# Altium footprint library PCB_Display_Doru.PcbLib: 47 footprints (part 2 of 3)
Each footprint in its own frame and in the unit in brackets; x right, y up, seen from the top. Pads: shape width x height; smd on the part's side, far side on the other; paste and mask are expansions set on the pad; w line width, h text height; cw(c..) or ccw(c..) is an arc to the next point about the centre after c.
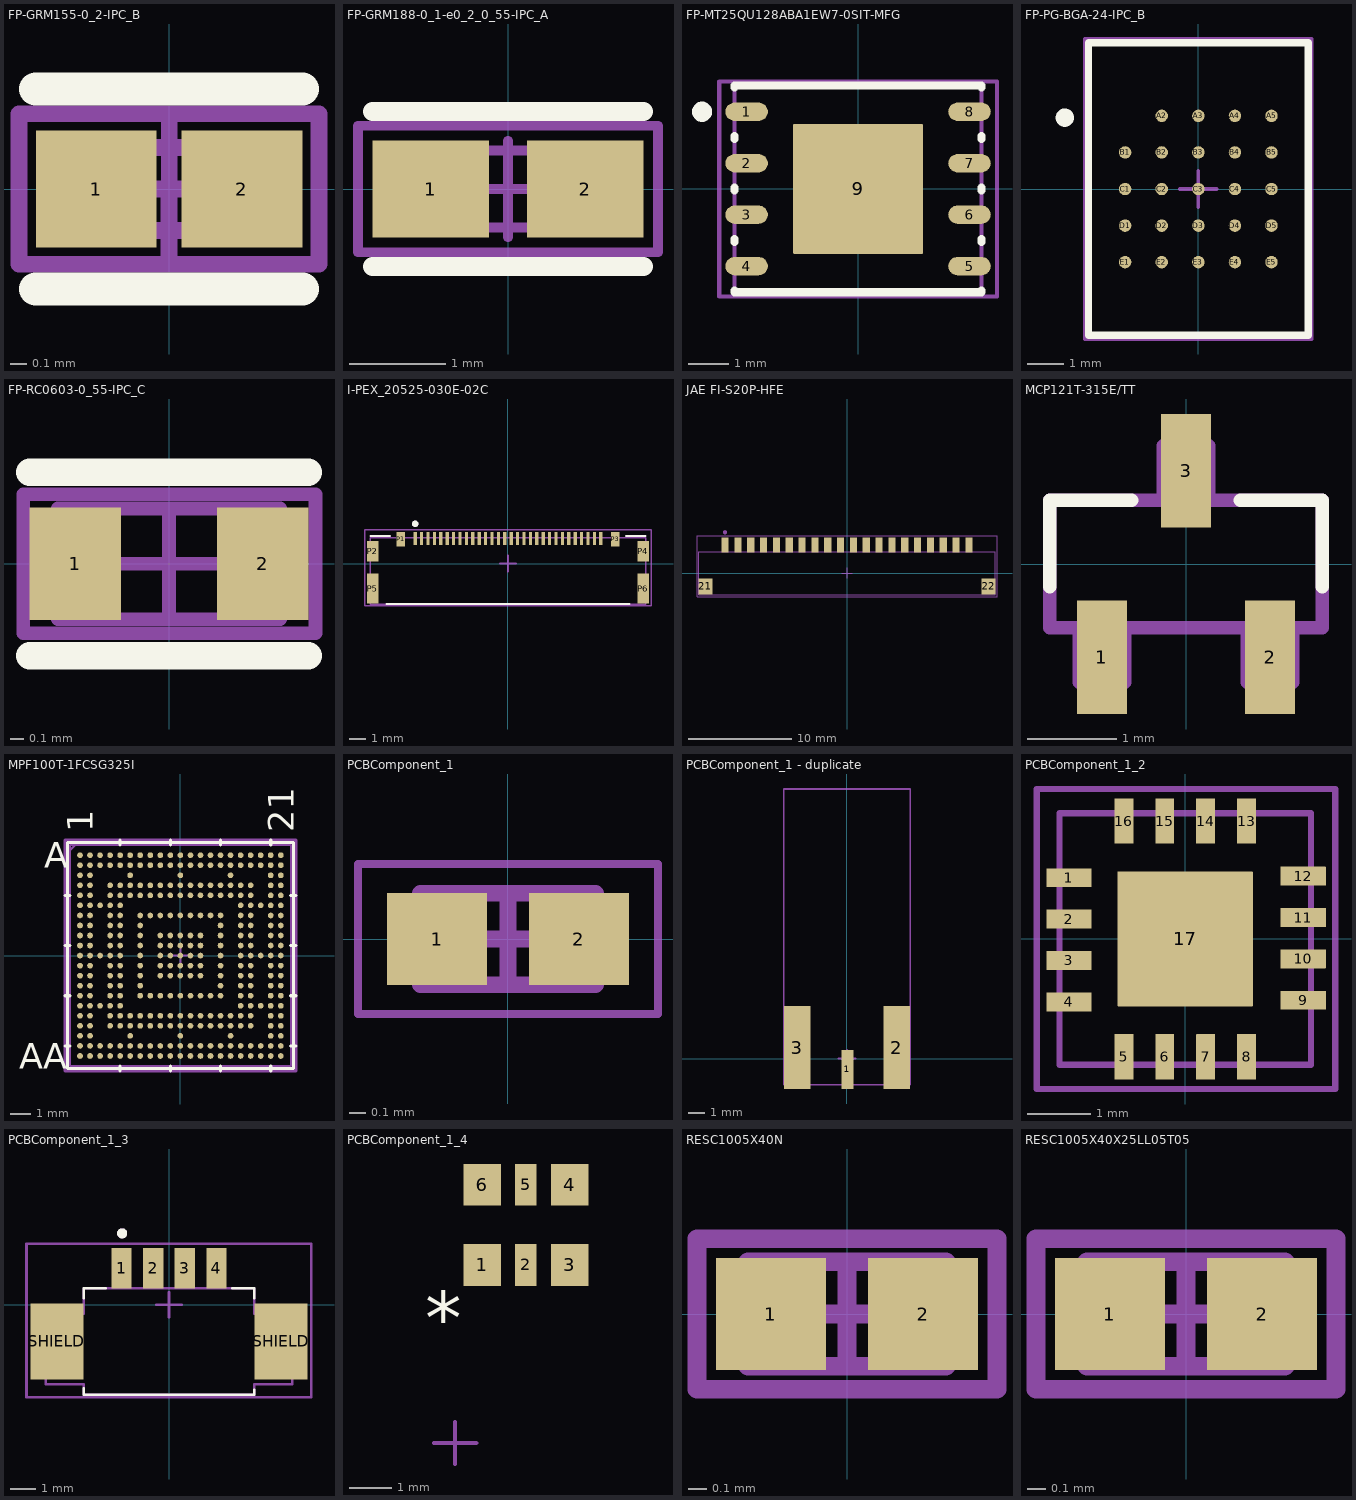
[diagram p1: the footprints below, top view; thin cyan lines are the x and y axes]

## FP-GRM155-0_2-IPC_B [mm]
height 8.35
pads (2):
  rrect1% 0.728x0.706 smd paste+0 mask+0.05: 1(-0.439,0) 2(0.439,0)
Top Overlay:
  lines w0.2: -0.803,-0.603 0.803,-0.603 ; -0.803,0.603 0.803,0.603
Top Assembly (Mech13):
  lines w0.1: -0.5,-0.25 -0.5,0.25 0.5,0.25 0.5,-0.25 -0.5,-0.25
  text ".Designator" at -0.646,-0.054 h0.3
Top Component Outline (Mech15):
  lines w0.1: -0.453,0 0.453,0 ; -0.001,-0.453 0,0.453 ; -0.904,-0.453 0.903,-0.453 0.903,0.453 -0.904,0.453 -0.904,-0.453
3D body "Cap_Murata_GRM155R61E225KE11D_eec.STEP": height 0.7, standoff 0, extent -0.5,-0.25 0.5,0.25

## FP-GRM188-0_1-e0_2_0_55-IPC_A [mm]
height 8.35
pads (2):
  rrect1% 1.208x1.012 smd paste+0: 1(-0.802,0) 2(0.802,0)
Top Overlay:
  lines w0.2: -1.406,-0.806 1.406,-0.806 ; -1.406,0.806 1.406,0.806
Top Assembly (Mech13):
  lines w0.1: -0.8,-0.4 -0.8,0.4 0.8,0.4 0.8,-0.4 -0.8,-0.4
  text ".Designator" at -0.666,-0.049 h0.3
Top Component Outline (Mech15):
  lines w0.1: -0.5,0 0.5,0 ; 0,-0.5 0,0.5 ; -1.558,-0.657 -1.558,0.658 1.558,0.658 1.558,-0.657 -1.558,-0.657
3D body "Cap_Murata_GRM188R60J106KE47D_eec.STEP": height 0.9, standoff 0, extent -0.8,-0.4 0.8,0.4

## FP-MT25QU128ABA1EW7-0SIT-MFG [mm]
height 8.35
pads (9):
  rrect100% 1.05x0.45 smd paste+0: 1(-2.75,1.905) 2(-2.75,0.635) 3(-2.75,-0.635) 4(-2.75,-1.905) 5(2.75,-1.905) 6(2.75,-0.635) 7(2.75,0.635) 8(2.75,1.905)
  rrect1% 3.2x3.2 smd: 9(0,0)
Top Overlay:
  circle w0.25: c-3.85,1.905 r0.125
  lines w0.2: -3.05,-2.505 -3.05,-2.55 3.05,-2.55 3.05,-2.505 ; -3.05,-1.305 -3.05,-1.235 ; -3.05,-0.035 -3.05,0.035 ; -3.05,1.235 -3.05,1.305 ; -3.05,2.505 -3.05,2.55 3.05,2.55 3.05,2.505 ; 3.05,-1.305 3.05,-1.235 ; 3.05,-0.035 3.05,0.035 ; 3.05,1.235 3.05,1.305
Top Assembly (Mech13):
  lines w0.1: -3.05,-2.55 -3.05,2.55 3.05,2.55 3.05,-2.55 -3.05,-2.55
  text ".Designator" at -0.588,-0.078 h0.3
Top Component Outline (Mech15):
  lines w0.1: -0.5,0 0.5,0 ; 0,-0.5 0,0.5 ; -3.426,-2.651 -3.426,2.649 3.428,2.649 3.428,-2.651 -3.426,-2.651
3D body "IC_Micron_MT25QU128ABA1EW7-0SIT_eec.STEP": height 0.8, standoff 0, extent -3.01,-2.5 3.01,2.5

## FP-PG-BGA-24-IPC_B [mm]
height 8.35
pads (24):
  round 0.34 smd paste+0: A2(-1,2) A3(0,2) A4(1,2) A5(2,2) B1(-2,1) B2(-1,1) B3(0,1) B4(1,1) B5(2,1) C1(-2,0) C2(-1,0) C3(0,0) C4(1,0) C5(2,0) D1(-2,-1) D2(-1,-1) D3(0,-1) D4(1,-1) D5(2,-1) E1(-2,-2) E2(-1,-2) E3(0,-2) E4(1,-2) E5(2,-2)
Top Overlay:
  circle w0.25: c-3.65,1.95 r0.125
  lines w0.2: -3,-4 -3,4 3,4 3,-4 -3,-4
Top Assembly (Mech13):
  lines w0.1: -3,-4 -3,4 3,4 3,-4 -3,-4
  text ".Designator" at -0.597,-0.065 h0.3
Top Component Outline (Mech15):
  lines w0.1: -0.5,0 0.5,0 ; 0,-0.5 0,0.5 ; -3.101,-4.099 3.1,-4.099 3.1,4.1 -3.101,4.1 -3.101,-4.099
3D body "IC_Infineon_Technologies_S80KS5123GABHI020_eec.STEP": height 1, standoff 0, extent -3,-4 3,4

## FP-RC0603-0_55-IPC_C [mm]
pads (2):
  rrect1% 0.659x0.812 smd paste+0 mask+0: 1(-0.677,0) 2(0.677,0)
Top Overlay:
  lines w0.2: -1.006,-0.663 1.006,-0.663 ; -1.006,0.66 1.006,0.66
Top Assembly (Mech13):
  lines w0.1: -0.8,-0.4 -0.8,0.4 0.8,0.4 0.8,-0.4 -0.8,-0.4
  text ".Designator" at -0.635,-0.071 h0.3
Top Component Outline (Mech15):
  lines w0.1: -0.4,0 0.4,0 ; 0,-0.4 0,0.4 0,0 ; -1.052,-0.501 -1.052,0.502 1.057,0.502 1.057,-0.501 -1.052,-0.501
3D body "Res_Yageo_RC0603FR-07100KL_eec.STEP": height 0.55, standoff 0, extent -0.8,-0.4 0.8,0.4

## I-PEX_20525-030E-02C [mm]
height 1.1
pads (36):
  rrect1% 0.2x0.8 smd mask+0.05: 1(-5.8,1.562) 2(-5.4,1.562) 3(-5,1.562) 4(-4.6,1.563) 5(-4.2,1.562) 6(-3.8,1.562) 7(-3.4,1.563) 8(-3,1.562) 9(-2.6,1.563) 10(-2.2,1.562) 11(-1.8,1.562) 12(-1.4,1.562) 13(-1,1.563) 14(-0.6,1.562) 15(-0.2,1.562) 16(0.2,1.562) 17(0.6,1.562) 18(1,1.563) 19(1.4,1.562) 20(1.8,1.562) 21(2.2,1.563) 22(2.6,1.562) 23(3,1.562) 24(3.4,1.562) 25(3.8,1.562) 26(4.2,1.562) 27(4.6,1.563) 28(5,1.562) 29(5.4,1.562) 30(5.8,1.562)
  rrect1% 0.55x0.9 smd: P1(-6.7,1.513) P3(6.7,1.512)
  rrect1% 0.71x1.3 smd: P2(-8.445,0.763) P4(8.445,0.763)
  rrect1% 0.71x1.85 smd: P5(-8.445,-1.562) P6(8.445,-1.562)
Top Overlay:
  circle w0.2: c-5.8,2.483 r0.1
  lines w0.127: -8.6,1.728 -7.37,1.728 ; -7.595,-2.537 7.595,-2.537 ; 7.37,1.728 8.6,1.728
Top Assembly (Mech13):
  circle w0.2: c-5.8,2.483 r0.1
  lines w0.1: -8.6,-2.537 8.6,-2.537 8.6,1.613 -8.6,1.613 -8.6,-2.537
  text ".Designator" at -0.612,-0.076 h0.3
Top Component Outline (Mech15):
  lines w0.1: -0.5,0 0.5,0 ; 0,-0.5 0,0.5 ; -8.953,-2.64 8.952,-2.64 8.952,2.113 -8.953,2.113 -8.953,-2.64
3D body "20525-x30E-02C_RECE_ASS'Y_STEP_R7_ALL.STEP": height 1, standoff 0, extent -8.6,-2.537 8.6,1.613

## JAE FI-S20P-HFE [mm]
pads (22):
  rrect1% 0.7x1.45 smd: 1(-11.875,2.754) 2(-10.625,2.754) 3(-9.375,2.754) 4(-8.125,2.754) 5(-6.875,2.754) 6(-5.625,2.754) 7(-4.375,2.754) 8(-3.125,2.754) 9(-1.875,2.754) 10(-0.625,2.754) 11(0.625,2.754) 12(1.875,2.754) 13(3.125,2.754) 14(4.375,2.754) 15(5.625,2.754) 16(6.875,2.754) 17(8.125,2.754) 18(9.375,2.754) 19(10.625,2.754) 20(11.875,2.754)
  rrect1% 1.35x1.6 smd: 21(-13.775,-1.3) 22(13.775,-1.3)
Top Assembly (Mech13):
  circle w0.2: c-11.875,3.974 r0.1
  lines w0.1: -14.45,-2.1 -14.45,2.1 14.45,2.1 14.45,-2.1 -14.45,-2.1
  text ".Designator" at -0.612,-0.076 h0.3
Top Component Outline (Mech15):
  lines w0.1: -0.5,0 0.5,0 ; 0,-0.5 0,0.5 ; -14.602,-2.297 -14.602,3.63 14.601,3.626 14.601,-2.297 -14.602,-2.297
3D body "K3D-FI-S20P-HFE_V1_JAE_Proprietary.step": height 1.81, standoff 0.01, extent -14.308,-2.244 14.292,3.056

## MCP121T-315E/TT [mil]
pads (3):
  rect 22x50 smd: 1(-37,-41) 2(37,-41) 3(0,41)
Top Overlay:
  lines w6: -60,-10 -60,28 -24,28 ; 24,28 60,28 60,-10
Top Assembly (Mech13):
  lines w6: -60,-28 -60,28 60,28 60,-28 -60,-28 ; -47,-52 -27,-52 -27,-28 -47,-28 -47,-52 ; -10,28 -10,52 10,52 10,28 -10,28 ; 27,-52 47,-52 47,-28 27,-28 27,-52
3D body "MCP121T-315E_TT.STEP": height 44.09, standoff 0, extent -57.09,-46.65 57.09,46.65

## MPF100T-1FCSG325I [mm]
pads (325):
  round 0.284 smd paste+0 mask+0: A1(-5,5) A2(-4.5,5) A3(-4,5) A4(-3.5,5) A5(-3,5) A6(-2.5,5) A7(-2,5) A8(-1.5,5) A9(-1,5) A10(-0.5,5) A11(0,5) A12(0.5,5) A13(1,5) A14(1.5,5) A15(2,5) A16(2.5,5) A17(3,5) A18(3.5,5) A19(4,5) A20(4.5,5) A21(5,5) AA1(-5,-5) AA2(-4.5,-5) AA3(-4,-5) AA4(-3.5,-5) AA5(-3,-5) AA6(-2.5,-5) AA7(-2,-5) AA8(-1.5,-5) AA9(-1,-5) AA10(-0.5,-5) AA11(0,-5) AA12(0.5,-5) AA13(1,-5) AA14(1.5,-5) AA15(2,-5) AA16(2.5,-5) AA17(3,-5) AA18(3.5,-5) AA19(4,-5) AA20(4.5,-5) AA21(5,-5) B1(-5,4.5) B2(-4.5,4.5) B3(-4,4.5) B4(-3.5,4.5) B5(-3,4.5) B6(-2.5,4.5) B7(-2,4.5) B8(-1.5,4.5) B9(-1,4.5) B10(-0.5,4.5) B11(0,4.5) B12(0.5,4.5) B13(1,4.5) B14(1.5,4.5) B15(2,4.5) B16(2.5,4.5) B17(3,4.5) B18(3.5,4.5) B19(4,4.5) B20(4.5,4.5) B21(5,4.5) C1(-5,4) C2(-4.5,4) C6(-2.5,4) C11(0,4) C16(2.5,4) C20(4.5,4) C21(5,4) D1(-5,3.5) D2(-4.5,3.5) D4(-3.5,3.5) D5(-3,3.5) D6(-2.5,3.5) D7(-2,3.5) D8(-1.5,3.5) D9(-1,3.5) D10(-0.5,3.5) D11(0,3.5) D12(0.5,3.5) D13(1,3.5) D14(1.5,3.5) D15(2,3.5) D16(2.5,3.5) D17(3,3.5) D18(3.5,3.5) D20(4.5,3.5) D21(5,3.5) E1(-5,3) E2(-4.5,3) E4(-3.5,3) E5(-3,3) E6(-2.5,3) E7(-2,3) E8(-1.5,3) E9(-1,3) E10(-0.5,3) E11(0,3) E12(0.5,3) E13(1,3) E14(1.5,3) E15(2,3) E16(2.5,3) E17(3,3) E18(3.5,3) E20(4.5,3) E21(5,3) F1(-5,2.5) F2(-4.5,2.5) F3(-4,2.5) F4(-3.5,2.5) F5(-3,2.5) F17(3,2.5) F18(3.5,2.5) F19(4,2.5) F20(4.5,2.5) F21(5,2.5) G1(-5,2) G2(-4.5,2) G4(-3.5,2) G5(-3,2) G7(-2,2) G8(-1.5,2) G9(-1,2) G10(-0.5,2) G11(0,2) G12(0.5,2) G13(1,2) G14(1.5,2) G15(2,2) G17(3,2) G18(3.5,2) G20(4.5,2) G21(5,2) H1(-5,1.5) H2(-4.5,1.5) H4(-3.5,1.5) H5(-3,1.5) H7(-2,1.5) H15(2,1.5) H17(3,1.5) H18(3.5,1.5) H20(4.5,1.5) H21(5,1.5) J1(-5,1) J2(-4.5,1) J4(-3.5,1) J5(-3,1) J7(-2,1) J9(-1,1) J10(-0.5,1) J11(0,1) J12(0.5,1) J13(1,1) J15(2,1) J17(3,1) J18(3.5,1) J20(4.5,1) J21(5,1) K1(-5,0.5) K2(-4.5,0.5) K4(-3.5,0.5) K5(-3,0.5) K7(-2,0.5) K9(-1,0.5) K10(-0.5,0.5) K11(0,0.5) K12(0.5,0.5) K13(1,0.5) K15(2,0.5) K17(3,0.5) K18(3.5,0.5) K20(4.5,0.5) K21(5,0.5) L1(-5,0) L2(-4.5,0) L3(-4,0) L4(-3.5,0) L5(-3,0) L7(-2,0) L9(-1,0) L10(-0.5,0) L11(0,0) L12(0.5,0) L13(1,0) L15(2,0) L17(3,0) L18(3.5,0) L19(4,0) L20(4.5,0) L21(5,0) M1(-5,-0.5) M2(-4.5,-0.5) M4(-3.5,-0.5) M5(-3,-0.5) M7(-2,-0.5) M9(-1,-0.5) M10(-0.5,-0.5) M11(0,-0.5) M12(0.5,-0.5) M13(1,-0.5) M15(2,-0.5) M17(3,-0.5) M18(3.5,-0.5) M20(4.5,-0.5) M21(5,-0.5) N1(-5,-1) N2(-4.5,-1) N4(-3.5,-1) N5(-3,-1) N7(-2,-1) N9(-1,-1) N10(-0.5,-1) N11(0,-1) N12(0.5,-1) N13(1,-1) N15(2,-1) N17(3,-1) N18(3.5,-1) N20(4.5,-1) N21(5,-1) P1(-5,-1.5) P2(-4.5,-1.5) P4(-3.5,-1.5) P5(-3,-1.5) P7(-2,-1.5) P15(2,-1.5) P17(3,-1.5) P18(3.5,-1.5) P20(4.5,-1.5) P21(5,-1.5) R1(-5,-2) R2(-4.5,-2) R4(-3.5,-2) R5(-3,-2) R7(-2,-2) R8(-1.5,-2) R9(-1,-2) R10(-0.5,-2) R11(0,-2) R12(0.5,-2) R13(1,-2) R14(1.5,-2) R15(2,-2) R17(3,-2) R18(3.5,-2) R20(4.5,-2) R21(5,-2) T1(-5,-2.5) T2(-4.5,-2.5) T3(-4,-2.5) T4(-3.5,-2.5) T5(-3,-2.5) T17(3,-2.5) T18(3.5,-2.5) T19(4,-2.5) T20(4.5,-2.5) T21(5,-2.5) U1(-5,-3) U2(-4.5,-3) U4(-3.5,-3) U5(-3,-3) U6(-2.5,-3) U7(-2,-3) U8(-1.5,-3) U9(-1,-3) U10(-0.5,-3) U11(0,-3) U12(0.5,-3) U13(1,-3) U14(1.5,-3) U15(2,-3) U16(2.5,-3) U17(3,-3) U18(3.5,-3) U20(4.5,-3) U21(5,-3) V1(-5,-3.5) V2(-4.5,-3.5) V4(-3.5,-3.5) V5(-3,-3.5) V6(-2.5,-3.5) V7(-2,-3.5) V8(-1.5,-3.5) V9(-1,-3.5) V10(-0.5,-3.5) V11(0,-3.5) V12(0.5,-3.5) V13(1,-3.5) V14(1.5,-3.5) V15(2,-3.5) V16(2.5,-3.5) V17(3,-3.5) V18(3.5,-3.5) V20(4.5,-3.5) V21(5,-3.5) W1(-5,-4) W2(-4.5,-4) W6(-2.5,-4) W11(0,-4) W16(2.5,-4) W20(4.5,-4) W21(5,-4) Y1(-5,-4.5) Y2(-4.5,-4.5) Y3(-4,-4.5) Y4(-3.5,-4.5) Y5(-3,-4.5) Y6(-2.5,-4.5) Y7(-2,-4.5) Y8(-1.5,-4.5) Y9(-1,-4.5) Y10(-0.5,-4.5) Y11(0,-4.5) Y12(0.5,-4.5) Y13(1,-4.5) Y14(1.5,-4.5) Y15(2,-4.5) Y16(2.5,-4.5) Y17(3,-4.5) Y18(3.5,-4.5) Y19(4,-4.5) Y20(4.5,-4.5) Y21(5,-4.5)
Top Overlay:
  lines w0.152: -5.753,-4.5 -5.499,-4.5 ; -5.753,-2 -5.499,-2 ; -5.753,0.5 -5.499,0.5 ; -5.753,3 -5.499,3 ; -3,-5.753 -3,-5.499 ; -3,5.499 -3,5.753 ; -0.5,-5.753 -0.5,-5.499 ; -0.5,5.499 -0.5,5.753 ; 2,-5.753 2,-5.499 ; 2,5.499 2,5.753 ; 4.5,-5.753 4.5,-5.499 ; 4.5,5.499 4.5,5.753 ; 5.499,-4.5 5.753,-4.5 ; 5.499,-2 5.753,-2 ; 5.499,0.5 5.753,0.5 ; 5.499,3 5.753,3 ; -5.626,-5.626 -5.626,5.626 5.626,5.626 5.626,-5.626 -5.626,-5.626
  text "AA" at -8.039,-5.635 h1.27
  text "A" at -6.769,4.365 h1.27
  text "21" at 5.635,6.134 h1.27
  text "1" at -4.365,6.134 h1.27
Top Assembly (Mech13):
  lines w0.1: -5.499,5.249 -5.249,5.499 ; -5.499,-5.499 -5.499,5.499 5.499,5.499 5.499,-5.499 -5.499,-5.499
  text ".Designator" at 0,0.188 h1
Top Component Outline (Mech15):
  lines w0.1: -0.5,0 0.5,0 ; 0,-0.5 0,0.5
  lines w0.152: -5.753,-5.753 5.753,-5.753 5.753,5.753 -5.753,5.753 -5.753,-5.753
3D body "MPF100T-FCSG325_MCH.step": height 1.45, standoff 0, extent -5.499,-5.499 5.499,5.499

## PCBComponent_1 [mm]
pads (2):
  rect 0.6x0.55 smd: 1(-0.425,0) 2(0.425,0)
Top Assembly (Mech13):
  lines w0.1: -0.525,-0.275 0.525,-0.275 0.525,0.275 -0.525,0.275 -0.525,-0.275
Top Component Outline (Mech15):
  lines w0.05: -0.9,-0.45 0.9,-0.45 0.9,0.45 -0.9,0.45 -0.9,-0.45
  lines w0.1: -0.275,0 0.275,0 ; 0,-0.275 0,0.275
3D body: height 0.4, standoff 0, extent 0.275,-0.275 0.525,0.275
3D body: height 0.4, standoff 0, extent -0.525,-0.275 -0.275,0.275
3D body: height 0.4, standoff 0, extent -0.275,-0.275 0.275,0.275

## PCBComponent_1 - duplicate [mil]
pads (3):
  rect 28x91 smd: 1(0.67,-25.5)
  rect 62x193 smd: 2(115.67,25.5) 3(-115.67,25.5)
Top Assembly (Mech13):
  lines w3.94: -147.64,-61.02 -147.64,627.95 147.64,627.95 147.64,-61.02 -147.64,-61.02
  text ".Designator" at -26.62,-2.67 h11.81
Top Component Outline (Mech15):
  lines w3.94: -19.68,0 19.68,0 ; 0,-19.68 0,19.68
3D body "34-1018.stp": height 159.45, standoff -135.83, extent -147.64,-61.02 147.64,627.95

## PCBComponent_1_2 [mm]
pads (17):
  rrect1% 0.72x0.3 smd: 1(-1.85,0.975) 2(-1.85,0.317) 3(-1.85,-0.342) 4(-1.85,-1) 9(1.875,-0.975) 10(1.875,-0.317) 11(1.875,0.342) 12(1.875,1)
  rrect1% 0.3x0.72 smd: 5(-0.975,-1.875) 6(-0.325,-1.875) 7(0.325,-1.875) 8(0.975,-1.875) 13(0.975,1.875) 14(0.325,1.875) 15(-0.325,1.875) 16(-0.975,1.875)
  rrect1% 2.15x2.15 smd: 17(0,0)
Top Assembly (Mech13):
  lines w0.1: -2,-2 -2,2 2,2 2,-2 -2,-2
  text ".Designator" at -0.612,-0.076 h0.3
Top Component Outline (Mech15):
  lines w0.1: -0.5,0 0.5,0 ; 0,-0.5 0,0.5 ; -2.362,-2.386 2.387,-2.386 2.387,2.386 -2.362,2.386 -2.362,-2.386
3D body "QFN16_4x4MC_MCH.step": height 1, standoff 0, extent -2,-2 2,2

## PCBComponent_1_3 [mm]
pads (6):
  rrect1% 0.8x1.6 smd: 1(-1.875,1.45) 2(-0.625,1.45) 3(0.625,1.45) 4(1.875,1.45)
  rrect1% 2.1x3 smd: SHIELD(-4.425,-1.45) SHIELD(4.425,-1.45)
Top Overlay:
  circle w0.2: c-1.85,2.82 r0.1
  lines w0.1: -3.375,-3.3 -3.375,-3.55 3.375,-3.55 3.375,-3.35 ; -3.375,0.25 -3.375,0.65 -2.5,0.65 ; 2.5,0.65 3.375,0.65 3.375,0.25
Top Assembly (Mech13):
  circle w0.2: c-1.85,2.82 r0.1
  lines w0.1: -4.875,-3.15 -3.375,-3.15 -3.375,-3.55 3.375,-3.55 3.375,-3.15 4.875,-3.15 4.875,-0.35 3.375,-0.35 3.375,0.65 -3.375,0.65 -3.375,-0.35 -4.875,-0.35 -4.875,-3.15
  text ".Designator" at -0.612,-0.076 h0.3
Top Component Outline (Mech15):
  lines w0.1: -0.5,0 0.5,0 ; 0,-0.5 0,0.5 ; -5.629,-3.652 -5.629,2.4 5.625,2.4 5.625,-3.652 -5.629,-3.652
3D body "53261-0471--3DModel-STEP-361473.STEP": height 3.4, standoff 0, extent -5.075,-3.35 5.075,1.85

## PCBComponent_1_4 [mil]
pads (6):
  rect 35x39 smd: 1(-46022,-46235) 3(-45940,-46235) 4(-45940,-46160) 6(-46022,-46160)
  rect 20x39 smd: 2(-45981,-46235) 5(-45981,-46160)
Top Overlay:
  text "*" at -46075,-46309 h50
Top Assembly (Mech13):
  text ".Designator" at -46071.32,-46404.57 h11.81
Top Component Outline (Mech15):
  lines w3.94: -46066.93,-46401.57 -46027.56,-46401.57 ; -46047.24,-46421.26 -46047.24,-46381.89

## RESC1005X40N [mm]
pads (2):
  rrect1% 0.59x0.6 smd mask+0.05: 1(-0.407,0) 2(0.407,0)
Top Assembly (Mech13):
  lines w0.1: -0.53,-0.28 0.53,-0.28 0.53,0.28 -0.53,0.28 -0.53,-0.28
  text ".Designator" at -0.676,-0.068 h0.3
Top Component Outline (Mech15):
  lines w0.1: -0.28,0 0.28,0 ; 0,-0.28 0,0.28 ; -0.803,-0.402 -0.803,0.403 0.803,0.403 0.803,-0.402 -0.803,-0.402
3D body "step_temp.STEP": height 0.4, standoff 0, extent -0.5,-0.25 0.5,0.25

## RESC1005X40X25LL05T05 [mm] "Chip Resistor, 2-Leads, Body 1.00x0.50mm, IPC High Density"
height 0.4
pads (2):
  rrect1% 0.59x0.6 smd mask+0.05: 1(-0.407,0) 2(0.407,0)
Top Assembly (Mech13):
  lines w0.1: -0.53,-0.28 0.53,-0.28 0.53,0.28 -0.53,0.28 -0.53,-0.28
  text ".Designator" at -0.676,-0.068 h0.3
Top Component Outline (Mech15):
  lines w0.1: -0.28,0 0.28,0 ; 0,-0.28 0,0.28 ; -0.803,-0.402 -0.803,0.403 0.803,0.403 0.803,-0.402 -0.803,-0.402
3D body "step_temp.STEP": height 0.4, standoff 0, extent -0.5,-0.25 0.5,0.25